# Altium footprint library PCB_Footprints.PcbLib: 303 footprints (part 7 of 19)
Each footprint in its own frame and in the unit in brackets; x right, y up, seen from the top. Pads: shape width x height; smd on the part's side, far side on the other; paste and mask are expansions set on the pad; w line width, h text height; cw(c..) or ccw(c..) is an arc to the next point about the centre after c.
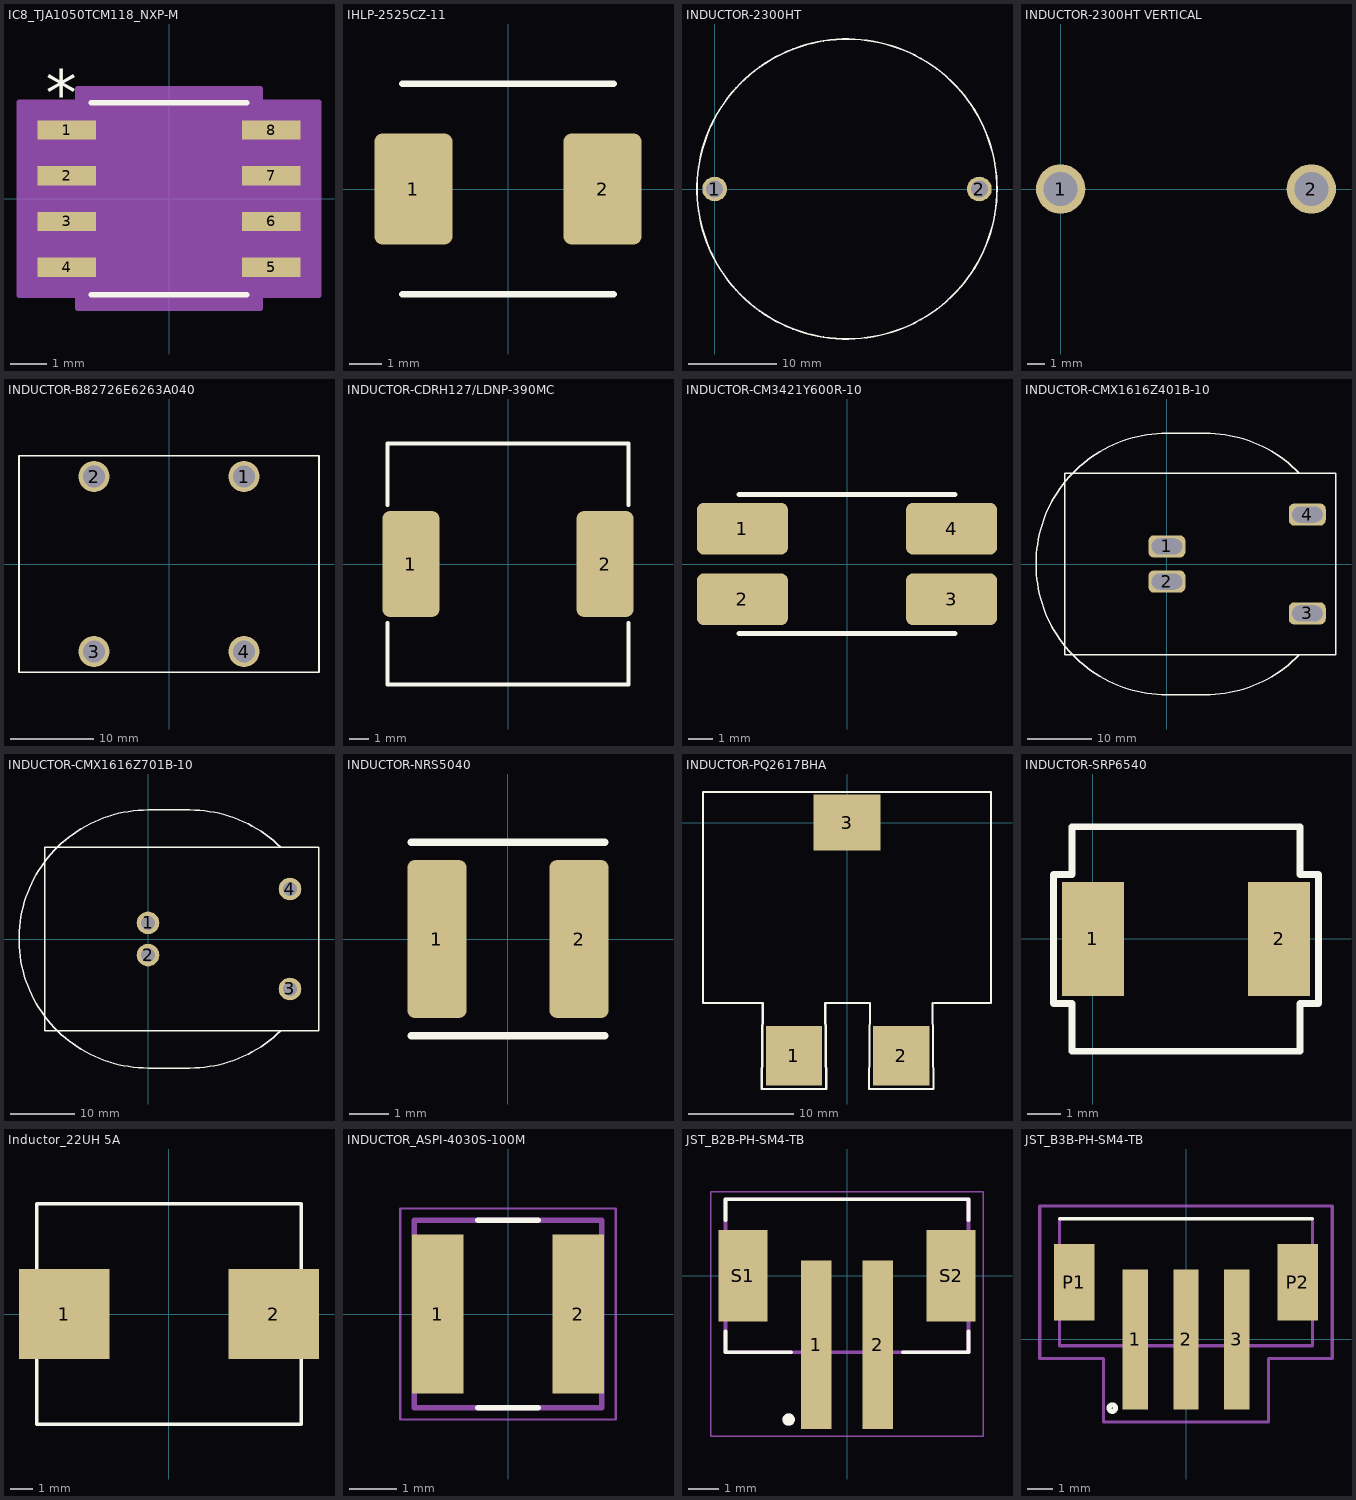
[diagram p6: the footprints below, top view; thin cyan lines are the x and y axes]

## IC8_TJA1050TCM118_NXP-M [mil]
pads (8):
  rect 64x21 smd paste+0 mask+0: 1(-112,75) 2(-112,25) 3(-112,-25) 4(-112,-75) 5(112,-75) 6(112,-25) 7(112,25) 8(112,75)
Top Overlay:
  lines w6: -85,-105 85,-105 ; -85,105 85,105
  text "*" at -134.5,91 h50
Mechanical 13:
  lines w0: -12,100 ccw(c0,100) 12,100
  lines w1: -122,-84.5 -122,-65.5 -80,-65.5 -80,-84.5 -122,-84.5 ; -122,-34.5 -122,-15.5 -80,-15.5 -80,-34.5 -122,-34.5 ; -122,15.5 -122,34.5 -80,34.5 -80,15.5 -122,15.5 ; -122,65.5 -122,84.5 -80,84.5 -80,65.5 -122,65.5 ; -80,-100 80,-100 80,100 -80,100 -80,-100 ; 80,-84.5 80,-65.5 122,-65.5 122,-84.5 80,-84.5 ; 80,-34.5 80,-15.5 122,-15.5 122,-34.5 80,-34.5 ; 80,15.5 80,34.5 122,34.5 122,15.5 80,15.5 ; 80,65.5 80,84.5 122,84.5 122,65.5 80,65.5
  text "*" at -77.5,47 h50
Mechanical 15:
  region: -100,-105.5 -164,-105.5 -164,105.5 -100,105.5 -100,120 100,120 100,105.5 164,105.5 164,-105.5 100,-105.5 100,-120 -100,-120
  lines w6: -164,-105.5 -164,105.5 -100,105.5 -100,120 100,120 100,105.5 164,105.5 164,-105.5 100,-105.5 100,-120 -100,-120 -100,-105.5 -164,-105.5
3D body "IC8_TJA1050TCM118_NXP.step": height 69.09, standoff 0, extent -122.01,-100 122.01,100

## IHLP-2525CZ-11 [mil] "Bourns IHLP2525CZER220M11 Inductor. from IHLP-2525CZ-11 datasheet, Revision: 08-Feb-17"
height 118.11
pads (2):
  rrect20% 95x135 smd: 1(-115,0) 2(115,0)
Top Overlay:
  lines w7.87: -128.94,-127.95 128.94,-127.95 ; -128.94,127.95 128.94,127.95
3D body: height 118.11, standoff 0, extent -127.95,-127.95 127.95,127.95

## INDUCTOR-2300HT [mm] "from datasheet Bourns 2300HT Series rev 03/11"
height 16.5
pads (2):
  round 2.8 hole 1.926: 1(0,0) 2(30,0)
Top Overlay:
  circle w0.2: c15,0 r17
3D body "2300HT-100-H-RC.stp": height 17.22, standoff -12.4, extent -2.049,-17.087 32.049,17.088

## INDUCTOR-2300HT VERTICAL [mm] "from datasheet Bourns 2300HT Series rev 12/20"
height 16.5
pads (2):
  round 2.8 hole 1.926: 1(0,0) 2(14.224,0)
3D body "2300HT-100-V-RC-clipped.stp": height 34.55, standoff -2.5, extent -1.442,-17.087 15.671,17.088

## INDUCTOR-B82726E6263A040 [mm] "B82726E6263A040 Size-A frrom tdk-electronics 12-2020"
height 45
pads (4):
  round 3.7 hole 2.6: 1(9,10.5) 2(-9,10.5) 3(-9,-10.5) 4(9,-10.5)
Top Overlay:
  lines w0.2: -18,-13 -18,13 18,13 18,-13 -18,-13
3D body "B82726E (Size A 2.2mm)_C62330-A115-A172_v01_public.stp": height 42.41, standoff -4, extent -22.85,-13 22.85,13

## INDUCTOR-CDRH127/LDNP-390MC [mm] "from Sumida SMD Power Inductor CDRH127/LD (datasheet)"
height 8
pads (2):
  rrect25% 2.9x5.4 smd: 1(-4.95,0) 2(4.95,0)
Top Overlay:
  lines w0.15: -6.125,-6.127 -6.103,-6.149
  lines w0.2: -6.15,-3 -6.15,-6.15 6.15,-6.15 6.15,-3 ; -6.15,3 -6.15,6.15 6.1,6.15 ; 6.15,3 6.15,6.15
3D body "User Library-DE1207.step": height 8, standoff 0, extent -6,-6 6,6

## INDUCTOR-CM3421Y600R-10 [mm] "from CM3421Y600R-10 drawing 12/20"
height 3.8
pads (4):
  rrect25% 3.66x2.08 smd: 1(-4.21,1.42) 2(-4.21,-1.42) 3(4.21,-1.42) 4(4.21,1.42)
Top Overlay:
  lines w0.2: -4.35,-2.8 0,-2.8 4.35,-2.8 ; -4.35,2.8 0,2.8 4.35,2.8
3D body "User Library-CM3421.STEP": height 3.28, standoff 0, extent -4.77,-2.8 4.77,2.8

## INDUCTOR-CMX1616Z401B-10 [mm] "from datasheet CMX1616Z401B-10 Drawing CMX1616Z401B-10-C"
height 16.5
pads (4):
  rrect50% 5.8x3.5 hole 2.5 slot 4.8 at 0 deg: 1(0,2.75) 2(0,-2.75) 3(22,-7.75) 4(22,7.75)
Top Overlay:
  lines w0.2: 20.737,-14.25 cw(c6,0) 6,-20.5 0,-20.5 cw(c0,0) 0,20.5 6,20.5 cw(c6,0) 20.737,14.25 ; -16,-14.25 -16,14.25 26.5,14.25 26.5,-14.25 -16,-14.25
3D body: height 1.6, standoff 0, extent -16,-14.25 26.5,14.25
3D body: height 0, standoff -4.9, extent -2.01,1.814 -0.11,3.714
3D body: height 0, standoff -4.9, extent 0.107,1.814 2.007,3.714
3D body: height 0, standoff -4.9, extent -2.01,-3.686 -0.11,-1.786
3D body: height 0, standoff -4.9, extent 0.107,-3.686 2.007,-1.786
3D body: height 3, standoff -4.9, extent 19.99,-8.686 21.89,-6.786
3D body: height 3, standoff -4.9, extent 22.107,-8.686 24.007,-6.786
3D body: height 3, standoff -4.9, extent 19.99,6.814 21.89,8.714
3D body: height 3, standoff -4.9, extent 22.107,6.814 24.007,8.714
3D body: height 16.5, standoff 1.6, extent -19,-20.494 22,20.495

## INDUCTOR-CMX1616Z701B-10 [mm] "from datasheet CMX1616Z701B-10 Drawing CMX1616Z701B-10-B"
pads (4):
  round 3.5 hole 2.2: 1(0,2.5) 2(0,-2.5) 3(22,-7.75) 4(22,7.75)
Top Overlay:
  lines w0.2: 20.533,-14.25 cw(c6.5,0) 6.5,-20 0,-20 cw(c0,0) 0,20 6.5,20 cw(c6.5,0) 20.533,14.25 ; -16,-14.25 -16,14.25 26.5,14.25 26.5,-14.25 -16,-14.25
3D body: height 1.6, standoff 0, extent -16,-14.25 26.5,14.25
3D body: height 16.5, standoff 1.6, extent -20,-19.994 20,19.994
3D body: height 0, standoff -4.9, extent -1.093,-3.593 1.094,-1.406
3D body: height 0, standoff -4.9, extent -1.093,1.407 1.094,3.594
3D body: height 3, standoff -4.9, extent 20.907,6.657 23.094,8.844
3D body: height 3, standoff -4.9, extent 20.907,-8.843 23.094,-6.656

## INDUCTOR-NRS5040 [mm] "from Tayo Yuden Automotive Application Guide 2019 (NRS datasheet)"
height 4.1
pads (2):
  rrect25% 1.5x4 smd: 1(-1.8,0) 2(1.8,0)
Top Overlay:
  lines w0.2: -2.45,-2.45 2.45,-2.45 ; -2.45,2.45 2.45,2.45
3D body: height 4.1, standoff 0, extent -2.45,-2.45 2.45,2.45

## INDUCTOR-PQ2617BHA [mm] "from datasheet BOURNS PQ2617BHA Series"
pads (3):
  rect 5.33x5.59 smd: 1(-5.018,-22.075) 2(5.132,-22.075)
  rect 6.35x5.28 smd: 3(0,0)
Top Overlay:
  lines w0.2: 8.092,-17.075 8.185,-25.224 2.079,-25.224 2.171,-17.075 -2.058,-17.075 -1.965,-25.224 -8.071,-25.224 -7.979,-17.075 -13.625,-17.075 -13.625,2.9 13.625,2.9 13.625,-17.075 8.225,-17.075
3D body "PQ2617BHA.stp": height 18, standoff -0.1, extent -13.387,-23.729 13.413,3.446

## INDUCTOR-SRP6540 [mm] "from datasheet BOURNS SRP6540 Series"
pads (2):
  rect 1.85x3.4 smd: 1(0,0) 2(5.55,0)
Top Overlay:
  lines w0.2: -1.176,-1.926 -0.625,-1.926 -0.625,-3.35 6.175,-3.35 6.175,-1.925 6.726,-1.926 ; -1.175,-1.926 -1.175,1.925 -0.625,1.925 -0.625,3.35 6.175,3.35 6.175,1.925 6.725,1.925 ; 6.502,1.925 6.725,1.925 ; 6.503,-1.926 6.725,-1.926 ; 6.725,-1.926 6.725,1.925 ; 6.725,-1.926 6.725,1.925
3D body "SRP6540.stp": height 4, standoff 0.01, extent -0.819,-3.251 6.369,3.251

## Inductor_22UH 5A [mm]
pads (2):
  rect 4.1x4.1 smd: 1(-4.75,0) 2(4.75,0)
Top Overlay:
  lines w0.15: -6,-5 -6,0 -6,5 6,5 6,-5 -6,-5
3D body: height 3.8, standoff 0, extent -5,-5 5,5

## INDUCTOR_ASPI-4030S-100M [mm]
height 3
pads (2):
  rect 1.1x3.4 smd: 1(-1.5,0) 2(1.5,0)
Top Overlay:
  lines w0.127: -0.637,-2 0.637,-2 ; -0.637,2 0.637,2
Mechanical 13:
  lines w0.127: -2,-2 2,-2 2,2 -2,2 -2,-2
Mechanical 15:
  lines w0.05: -2.3,-2.25 2.3,-2.25 2.3,2.25 -2.3,2.25 -2.3,-2.25
3D body "ASPI4030S100M.STEP": height 3, standoff 0, extent -2,-2 2,2

## JST_B2B-PH-SM4-TB [mm]
height 6.6
pads (4):
  rect 1x5.5 smd: 1(-1,-2.25) 2(1,-2.25)
  rect 1.6x3 smd: S1(-3.4,0) S2(3.4,0)
Top Overlay:
  circle w0.2: c-1.905,-4.699 r0.1
  lines w0.127: -3.975,-1.82 -3.975,-2.5 -1.82,-2.5 ; -3.975,1.82 -3.975,2.5 3.975,2.5 3.975,1.82 ; 1.82,-2.5 3.975,-2.5 3.975,-1.82
Mechanical 13:
  circle w0.2: c-1.905,-4.699 r0.1
  lines w0.127: -3.975,-2.5 -3.975,2.5 3.975,2.5 3.975,-2.5 -3.975,-2.5
Mechanical 15:
  lines w0.05: -4.45,-5.25 4.45,-5.25 4.45,2.75 -4.45,2.75 -4.45,-5.25
3D body "step_temp.STEP": height 6.75, standoff 0, extent -3.975,-4.5 3.975,2.5

## JST_B3B-PH-SM4-TB [mm]
pads (5):
  rect 1x5.5 smd: 1(-2,0) 2(0,0) 3(2,0)
  rect 1.6x3 smd: P1(-4.4,2.25) P2(4.4,2.25)
Top Overlay:
  circle w0.2: c-2.9,-2.7 r0.127
  lines w0.127: -4.975,4.75 4.975,4.75
Mechanical 13:
  lines w0.127: -4.975,4.75 -4.975,-0.25 4.975,-0.25 4.975,4.75
Mechanical 15:
  lines w0.127: -5.75,-0.75 -5.75,5.25 5.75,5.25 5.75,-0.75 3.25,-0.75 3.25,-3.25 -3.25,-3.25 -3.25,-0.75 -5.75,-0.75
3D body "B3B-PH-SM4-TB.step": height 6.6, standoff -0.15, extent -4.997,-2.23 4.953,4.77